# Altium footprint library PcbLib_Pin_Headers_part2.PcbLib: 68 footprints (part 5 of 5)
Each footprint in its own frame and in the unit in brackets; x right, y up, seen from the top. Pads: shape width x height; smd on the part's side, far side on the other; paste and mask are expansions set on the pad; w line width, h text height; cw(c..) or ccw(c..) is an arc to the next point about the centre after c.
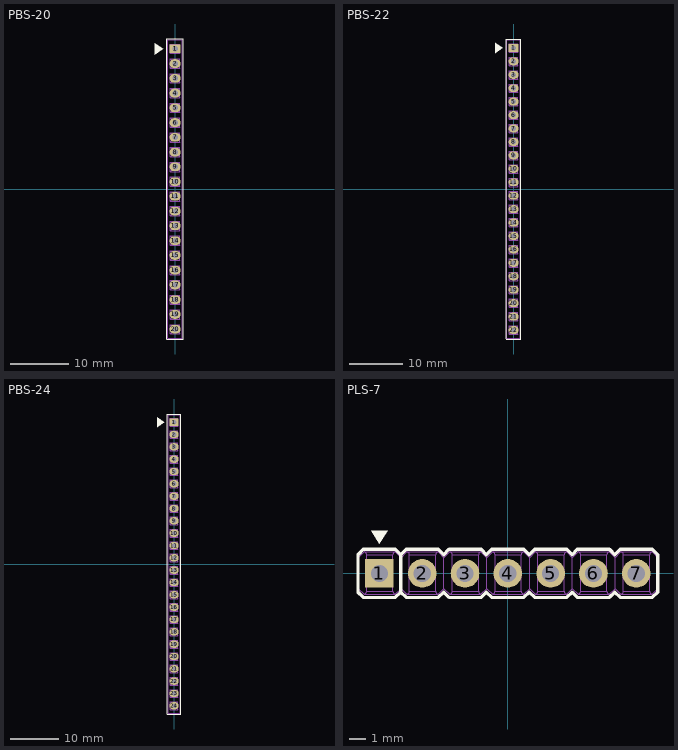
[diagram p4: the footprints below, top view; thin cyan lines are the x and y axes]

## PBS-20 [mm] "H = 8.5mm"
pads (20):
  rect 1.9x1.5 hole 0.95: 1(0,24.17)
  oval 1.9x1.5 hole 0.95: 2(0,21.63) 3(0,19.09) 4(0,16.55) 5(0,14.01) 6(0,11.47) 7(0,8.93) 8(0,6.39) 9(0,3.85) 10(0,1.31) 11(0,-1.23) 12(0,-3.77) 13(0,-6.31) 14(0,-8.85) 15(0,-11.39) 16(0,-13.93) 17(0,-16.47) 18(0,-19.01) 19(0,-21.55) 20(0,-24.09)
Top Overlay:
  region: -2,24.16 -3.5,23.16 -3.5,25.16
  lines w0.2: -1.4,-25.78 1.4,-25.78 1.4,25.86 -1.4,25.86 -1.4,-25.78
Top Assy:
  drawing of 524 lines, arcs and shapes, not listed
  text ".Designator" at 2.467,-3.443 h2
3D body "User Library-PBS_(DS1023)_1line_connectors_h=5_0_8_5mm_step_2_54mm (1).step": height 8.5, standoff -3, extent -1.25,-25.61 1.25,25.69

## PBS-22 [mm] "H = 8.5mm"
pads (22):
  rect 1.9x1.5 hole 0.95: 1(0,26.71)
  oval 1.9x1.5 hole 0.95: 2(0,24.17) 3(0,21.63) 4(0,19.09) 5(0,16.55) 6(0,14.01) 7(0,11.47) 8(0,8.93) 9(0,6.39) 10(0,3.85) 11(0,1.31) 12(0,-1.23) 13(0,-3.77) 14(0,-6.31) 15(0,-8.85) 16(0,-11.39) 17(0,-13.93) 18(0,-16.47) 19(0,-19.01) 20(0,-21.55) 21(0,-24.09) 22(0,-26.63)
Top Overlay:
  region: -2,26.7 -3.5,25.7 -3.5,27.7
  lines w0.2: -1.4,-28.32 1.4,-28.32 ; -1.4,-28.3 -1.4,28.4 1.4,28.4 1.4,-28.3
Top Assy:
  drawing of 576 lines, arcs and shapes, not listed
  text ".Designator" at 2.467,-3.443 h2
3D body "User Library-PBS_(DS1023)_1line_connectors_h=5_0_8_5mm_step_2_54mm (2).step": height 8.5, standoff -3, extent -1.25,-28.15 1.25,28.23

## PBS-24 [mm] "H = 8.5mm"
pads (24):
  rect 1.9x1.5 hole 0.95: 1(0,29.21)
  oval 1.9x1.5 hole 0.95: 2(0,26.67) 3(0,24.13) 4(0,21.59) 5(0,19.05) 6(0,16.51) 7(0,13.97) 8(0,11.43) 9(0,8.89) 10(0,6.35) 11(0,3.81) 12(0,1.27) 13(0,-1.27) 14(0,-3.81) 15(0,-6.35) 16(0,-8.89) 17(0,-11.43) 18(0,-13.97) 19(0,-16.51) 20(0,-19.05) 21(0,-21.59) 22(0,-24.13) 23(0,-26.67) 24(0,-29.21)
Top Overlay:
  region: -2,29.2 -3.5,28.2 -3.5,30.2
  lines w0.2: -1.4,-30.9 -1.4,30.9 1.4,30.9 1.4,-30.9 -1.4,-30.9
Top Assy:
  drawing of 628 lines, arcs and shapes, not listed
  text ".Designator" at 2.467,-3.443 h2
3D body "User Library-PBS_(DS1023)_1line_connectors_h=5_0_8_5mm_step_2_54mm (1).step": height 8.5, standoff -3, extent -1.25,-30.73 1.25,30.73

## PLS-7 [mm]
pads (7):
  rect 1.7x1.7 hole 1.02: 1(-7.62,0)
  round 1.7 hole 1.02: 2(-5.08,0) 3(-2.54,0) 4(0,0) 5(2.54,0) 6(5.08,0) 7(7.62,0)
Top Overlay:
  region: -7.62,1.746 -7.124,2.54 -8.116,2.54
  lines w0.2: -6.35,-1.111 -6.35,1.111 ; -6.35,-1.111 -6.032,-1.429 -4.127,-1.429 -3.81,-1.111 -3.492,-1.429 -1.587,-1.429 -1.27,-1.111 -0.952,-1.429 0.953,-1.429 1.27,-1.111 1.588,-1.429 3.493,-1.429 3.81,-1.111 4.128,-1.429 6.033,-1.429 6.35,-1.111 6.668,-1.429 8.573,-1.429 8.89,-1.111 8.89,1.111 8.572,1.429 6.667,1.429 6.35,1.111 6.032,1.429 4.127,1.429 3.81,1.111 3.492,1.429 1.587,1.429 1.27,1.111 0.953,1.429 -0.953,1.429 -1.27,1.111 -1.587,1.429 -3.492,1.429 -3.81,1.111 -4.127,1.429 -6.032,1.429 -6.35,1.111 ; -6.35,-1.111 -6.667,-1.429 -8.572,-1.429 -8.89,-1.111 -8.89,1.111 -8.572,1.429 -6.667,1.429 -6.35,1.111
Top Assy:
  drawing of 219 lines, arcs and shapes, not listed
  text ".Designator" at -3.443,-3.067 h2
3D body "PLS-7.x_t": height 8.74, standoff -2.8, extent -8.89,-1.27 8.89,1.27